# Altium footprint library BKRES_PcbLib.PcbLib: 33 footprints (part 1 of 3)
Each footprint in its own frame and in the unit in brackets; x right, y up, seen from the top. Pads: shape width x height; smd on the part's side, far side on the other; paste and mask are expansions set on the pad; w line width, h text height; cw(c..) or ccw(c..) is an arc to the next point about the centre after c.
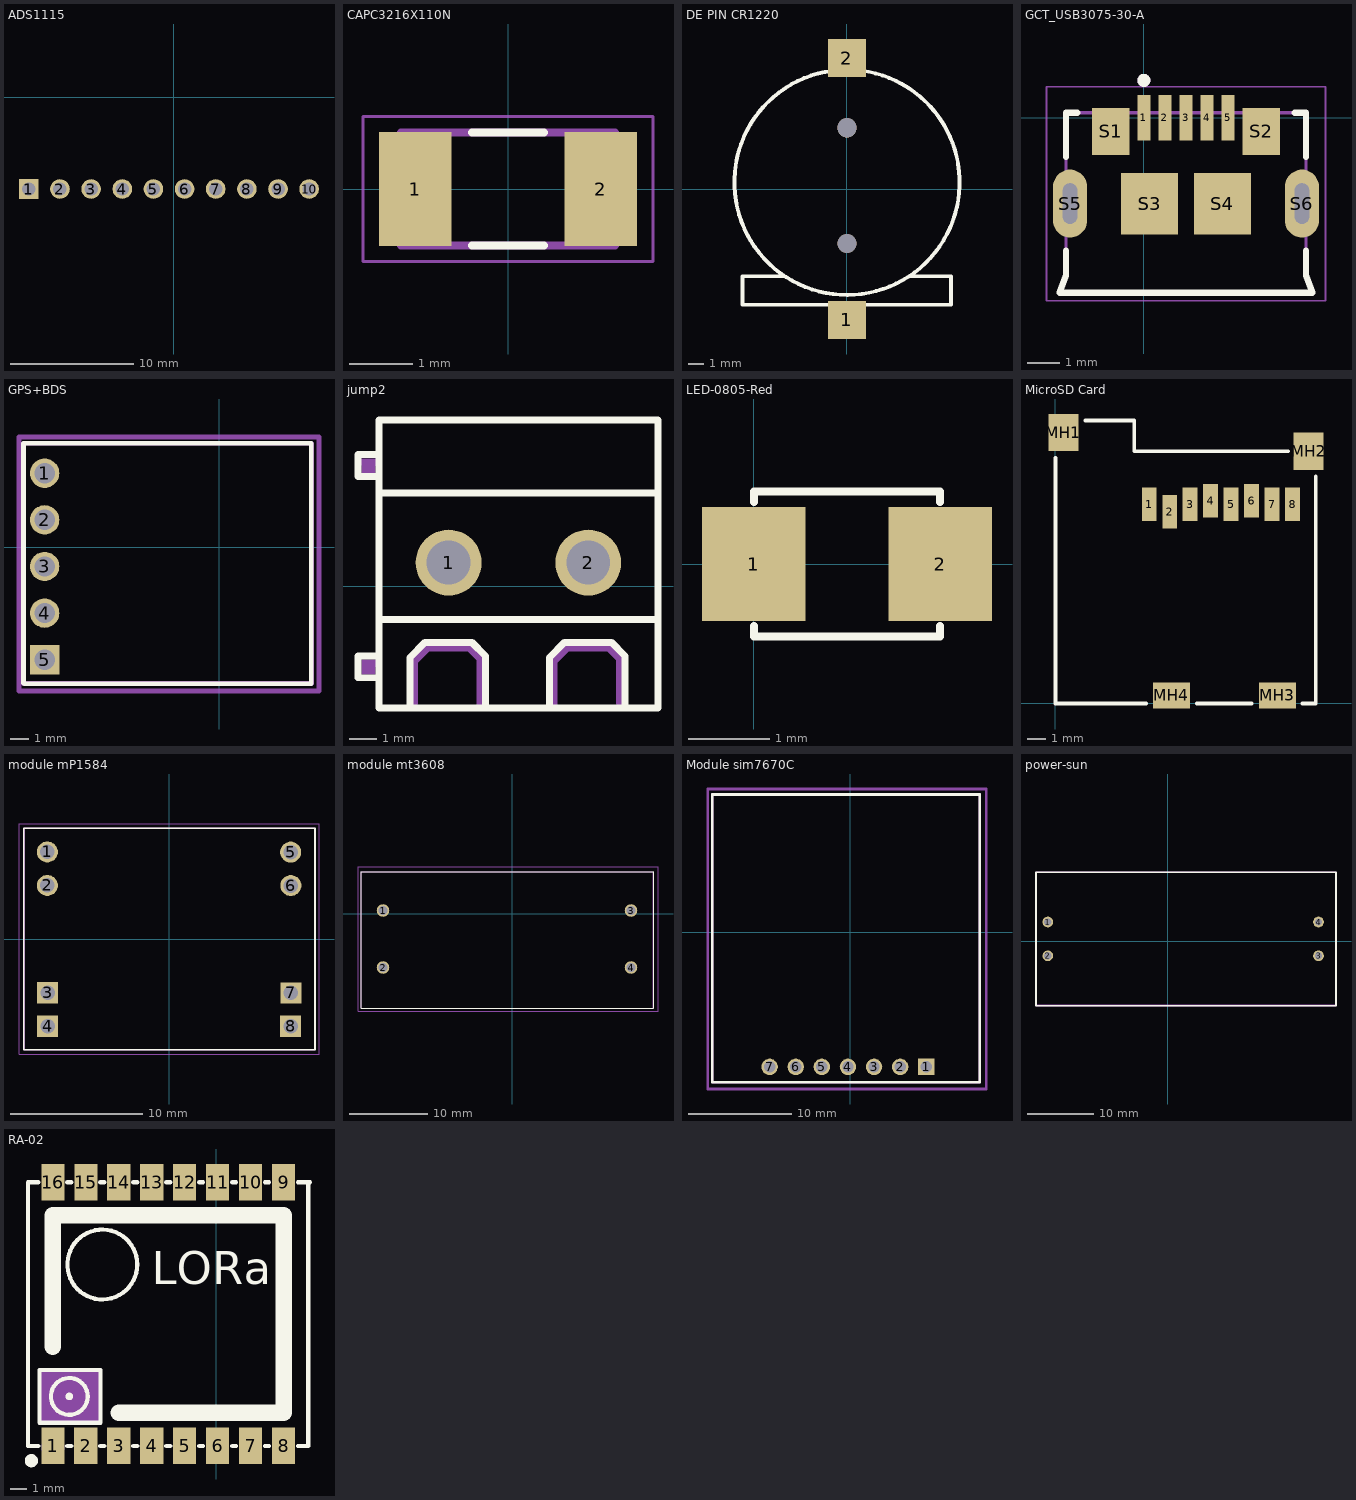
[diagram p0: the footprints below, top view; thin cyan lines are the x and y axes]

## ADS1115 [mm]
pads (10):
  rect 1.6x1.6 hole 1.1: 1(-11.811,-7.493)
  round 1.6 hole 1.1: 2(-9.271,-7.493) 3(-6.731,-7.493) 4(-4.191,-7.493) 5(-1.651,-7.493) 6(0.889,-7.493) 7(3.429,-7.493) 8(5.969,-7.493) 9(8.509,-7.493) 10(11.049,-7.493)
3D body "16Bit I2C ADC+PGA - ADS1115.stp": height 13.74, standoff 11, extent -14.351,-9.525 13.589,7.747

## CAPC3216X110N [mm]
pads (2):
  rect 1.16x1.82 smd: 1(-1.475,0) 2(1.475,0)
Top Overlay:
  lines w0.127: -0.57,-0.9 0.57,-0.9 ; -0.57,0.9 0.57,0.9
Mechanical 13:
  lines w0.127: -1.7,-0.9 1.7,-0.9 1.7,0.9 -1.7,0.9 -1.7,-0.9
Mechanical 15:
  lines w0.05: -2.308,-1.15 2.308,-1.15 2.308,1.15 -2.308,1.15 -2.308,-1.15
3D body "T491A105M016AT.STEP": height 1.8, standoff 0, extent -1.6,-0.8 1.6,0.8

## DE PIN CR1220 [mm]
pads (2):
  rect 2.5x2.5 smd: 1(0,-8.6) 2(0,8.6)
via 0.005,-3.579 diameter 1.27 hole 1.27
via 0,4.026 diameter 1.27 hole 1.27
Top Overlay:
  lines w0.254: -4.194,-5.725 -6.868,-5.725 -6.868,-7.6 6.833,-7.6 6.833,-5.725 4.158,-5.725 ; -0.038,7.836 ccw(c0.005,0.439) 0,7.836
3D body "CR1220 SMD.STEP": height 4.27, standoff -0.48, extent -7.389,-9.42 7.36,9.38

## DO [mm]
3D body "Gravity Dissolved Oxygen Sensor v1.0.STEP": height 13.2, standoff 0, extent -33.737,-25.525 29.763,6.475

## EC [mm]
3D body "EC MEter DF Robot v1 v1.step": height 12.6, standoff 0, extent -15.49,-23.077 16.51,42.635

## GCT_USB3075-30-A [mm]
height 2.66
pads (11):
  rect 0.4x1.4 smd: 1(0,0) 2(0.65,0) 3(1.3,0) 4(1.95,0) 5(2.6,0)
  rect 1.15x1.45 smd: S1(-1.02,-0.42) S2(3.62,-0.42)
  rect 1.75x1.9 smd: S3(0.175,-2.65) S4(2.425,-2.65)
  oval 1.05x2.1 hole 0.45 slot 1.25 at 90 deg: S5(-2.275,-2.65) S6(4.875,-2.65)
Top Overlay:
  circle w0.2: c0,1.15 r0.1
  lines w0.2: -2.4,-4.1 -2.4,-4.86 -2.6,-5.4 5.2,-5.4 5,-4.86 5,-4.1 ; -2.4,-1.2 -2.4,0.15 -2.05,0.15 ; 4.65,0.15 5,0.15 5,-1.2
Mechanical 13:
  circle w0.2: c0,1.15 r0.1
  lines w0.1: -2.6,-5.4 -2.4,-4.86 -2.4,0.15 5,0.15 5,-4.86 5.2,-5.4 -2.6,-5.4
Mechanical 15:
  lines w0.05: -3,-5.65 5.6,-5.65 5.6,0.95 -3,0.95 -3,-5.65
3D body "step_temp.STEP": height 2.7, standoff -1, extent -2.583,-5.373 5.217,0.177

## GPS+BDS [mm]
pads (5):
  round 1.6 hole 1.1: 1(-9.498,4.024) 2(-9.498,1.484) 3(-9.498,-1.056) 4(-9.498,-3.596)
  rect 1.6x1.6 hole 1.1: 5(-9.498,-6.136)
Top Overlay:
  lines w0.254: -10.652,5.647 -10.652,-7.408 -10.619,-7.441 5.011,-7.441 5.022,-7.43 5.022,5.647 5.011,5.658 -10.641,5.658
Mechanical 1:
  lines w0.254: -10.663,-7.419 -10.652,-7.43 ; -10.663,5.637 -10.641,5.658 ; 5.022,-7.43 5.033,-7.441
Mechanical 13:
  lines w0.254: -10.663,-7.419 -10.663,5.637 ; -10.652,-7.43 5.022,-7.43 ; -10.641,5.658 5.033,5.658 5.033,-7.441
Mechanical 15:
  lines w0.254: -10.897,-7.837 -10.897,-7.707 -10.897,5.994 5.445,5.994 5.445,-7.837 -10.897,-7.837
3D body: height 11.5, standoff 11, extent -10.709,-7.456 5.024,5.647

## jump2 [mm]
pads (2):
  round 2.4 hole 1.6 paste-2539.97 mask+0.051: 1(-13.335,0.855) 2(-8.255,0.855)
Top Overlay:
  lines w0.254: -15.875,-3.336 -16.637,-3.336 -16.637,-2.538 -15.875,-2.538 ; -15.875,-1.218 -5.715,-1.218 ; -15.875,3.392 -5.715,3.392 ; -15.875,3.994 -16.637,3.994 -16.637,4.792 -15.875,4.792 ; -14.745,-4.445 -14.745,-2.595 -14.195,-2.045 -12.495,-2.045 -11.995,-2.545 -11.995,-4.445 ; -9.665,-4.445 -9.665,-2.595 -9.115,-2.045 -7.415,-2.045 -6.915,-2.545 -6.915,-4.445 ; -15.875,-4.445 -5.715,-4.445 -5.715,6.055 -15.875,6.055 -15.875,-4.445
Mechanical 15:
  region: -15.995,4.645 -16.515,4.645 -16.505,4.135 -16.015,4.115
  region: -15.995,-2.675 -16.505,-2.675 -16.505,-3.205 -16.015,-3.205
  region: -14.722,-4.245 -14.722,-2.745 -14.722,-2.732 -14.717,-2.708 -14.708,-2.685 -14.694,-2.664 -14.685,-2.655 -14.185,-2.155 -14.176,-2.146 -14.155,-2.132 -14.132,-2.123 -14.108,-2.118 -14.095,-2.118 -12.595,-2.118 -12.583,-2.118 -12.558,-2.123 -12.535,-2.132 -12.514,-2.146 -12.505,-2.155 -12.105,-2.555 -12.096,-2.564 -12.082,-2.585 -12.073,-2.608 -12.068,-2.632 -12.068,-2.645 -12.068,-4.245 -12.068,-4.298 -12.142,-4.372 -12.248,-4.372 -12.322,-4.298 -12.322,-4.245 -12.322,-2.698 -12.648,-2.372 -14.042,-2.372 -14.468,-2.798 -14.468,-4.245 -14.468,-4.298 -14.542,-4.372 -14.648,-4.372 -14.722,-4.298
  region: -9.642,-4.245 -9.642,-2.745 -9.642,-2.732 -9.637,-2.708 -9.628,-2.685 -9.614,-2.664 -9.605,-2.655 -9.105,-2.155 -9.096,-2.146 -9.075,-2.132 -9.052,-2.123 -9.028,-2.118 -9.015,-2.118 -7.515,-2.118 -7.503,-2.118 -7.478,-2.123 -7.455,-2.132 -7.434,-2.146 -7.425,-2.155 -7.025,-2.555 -7.016,-2.564 -7.002,-2.585 -6.993,-2.608 -6.988,-2.632 -6.988,-2.645 -6.988,-4.245 -6.988,-4.298 -7.062,-4.372 -7.168,-4.372 -7.242,-4.298 -7.242,-4.245 -7.242,-2.698 -7.568,-2.372 -8.962,-2.372 -9.388,-2.798 -9.388,-4.245 -9.388,-4.298 -9.462,-4.372 -9.568,-4.372 -9.642,-4.298
3D body "KF128-5.08-2P.STEP": height 14.59, standoff -3.36, extent -16.429,-4.318 -5.669,5.982

## LED-0805-Red [mil]
pads (2):
  rect 50x55 smd: 1(0,0) 2(90,0)
Top Overlay:
  lines w4: 0,-30 0,-35 90,-35 90,-30 ; 0,30 0,35 90,35 90,30
3D body "User Library-led_0805-red.step": height 43.31, standoff 0, extent 5.25,-24.6 84.77,24.62

## MicroSD Card [mm] "Connector; SD Card Type A, SM, 9 Position, Right Angle, Pitch 2.5 mm, Body 23.3 x 27.4 x 3.4 mm (LxWxH)"
height 3.4
pads (12):
  rect 0.8x1.8 smd: 1(5.04,10.7) 2(6.14,10.3) 3(7.24,10.7) 4(8.34,10.9) 5(9.44,10.7) 6(10.54,10.9) 7(11.64,10.7) 8(12.74,10.7)
  rect 1.6x2 smd: MH1(0.43,14.55) MH2(13.6,13.55)
  rect 2x1.4 smd: MH3(11.93,0.43) MH4(6.23,0.43)
Top Overlay:
  lines w0.2: 0,13.18 0,0 4.87,0 ; 1.6,15.2 4.24,15.2 4.24,13.55 12.5,13.55 ; 7.59,0 10.55,0 ; 13.27,0 13.98,0 13.98,12.19
3D body "SW3dPS-micro sd soket.STEP": height 1.72, standoff -0.01, extent -0.21,-0.49 14.39,15.51

## module mP1584 [mm]
height 6.6
pads (8):
  round 1.6 hole 1.1: 1(-9.271,6.604) 2(-9.271,4.064) 5(9.2,6.59) 6(9.21,4.06)
  rect 1.6x1.6 hole 1.1: 3(-9.25,-4.08) 4(-9.25,-6.62) 7(9.21,-4.09) 8(9.19,-6.62)
Top Overlay:
  lines w0.127: -11.06,-8.4 -11.06,8.4 11.04,8.4 11.04,-8.4 -11.06,-8.4
Mechanical 13:
  lines w0.127: -11.04,-8.4 -11.04,8.4 11.06,8.4 11.06,-8.4 -11.04,-8.4
Mechanical 15:
  lines w0.05: -11.42,-8.76 11.35,-8.76 11.35,8.76 -11.42,8.76 -11.42,-8.76
3D body "D-SUN dc-dc step down converter.step": height 15.19, standoff 11, extent -11.05,-8.4 11.05,8.4

## module mt3608 [mm]
height 6.6
pads (4):
  round 1.6 hole 1.1: 1(-16.383,0.381) 2(-16.383,-6.858) 3(15.113,0.381) 4(15.113,-6.858)
Top Overlay:
  lines w0.127: -19.177,-12.065 -19.177,5.334 17.907,5.334 17.907,-12.065 -19.177,-12.065
Mechanical 13:
  lines w0.127: -19.177,-12.065 -19.177,5.334 17.907,5.334 17.907,-12.065 -19.177,-12.065
Mechanical 15:
  lines w0.05: -19.558,-12.446 18.542,-12.446 18.542,5.969 -19.558,5.969 -19.558,-12.446
3D body "MT3608 Converter.STEP": height 15.15, standoff 7.85, extent -19.21,-12.091 17.94,5.334
3D body "1x1 Male Pin Header.stp": height 1.54, standoff -12, extent 13.838,-0.869 16.383,1.631
3D body "1x1 Male Pin Header.stp": height 1.54, standoff -12, extent 13.843,-8.125 16.388,-5.625
3D body "1x1 Male Pin Header.stp": height 1.54, standoff -12, extent -17.676,-0.846 -15.131,1.654
3D body "1x1 Male Pin Header.stp": height 1.54, standoff -12, extent -17.648,-8.103 -15.103,-5.603

## Module sim7670C [mm]
pads (7):
  rect 1.6x1.6 hole 1.1: 1(7.408,-13.095)
  round 1.6 hole 1.1: 2(4.868,-13.095) 3(2.328,-13.095) 4(-0.212,-13.095) 5(-2.752,-13.095) 6(-5.292,-13.095) 7(-7.832,-13.095)
Top Overlay:
  lines w0.254: -13.395,-14.601 12.605,-14.601 12.605,13.399 -13.395,13.399 -13.395,-14.601
Mechanical 13:
  lines w0.254: -13.395,-14.601 12.605,-14.601 12.605,13.399 -13.395,13.399 -13.395,-14.601
Mechanical 15:
  lines w0.254: -13.866,-15.248 13.258,-15.248 13.258,13.935 -13.866,13.935 -13.866,-15.248
3D body: height 12.24, standoff 11, extent -13.395,-14.601 12.605,13.399

## pH [mm]
3D body "pH_meter_CC.step": height 18.04, standoff -4.75, extent -32.131,-16.383 31.748,15.367

## power-sun [mm]
pads (4):
  round 1.6 hole 1.1: 1(-17.95,2.883) 2(-17.95,-2.197) 3(22.65,-2.197) 4(22.65,2.883)
Top Overlay:
  lines w0.254: -19.736,-9.677 25.273,-9.677 25.273,10.351 -19.736,10.351 -19.736,-9.677
Mechanical 13:
  lines w0.254: -19.736,-9.652 -19.736,10.348 ; -19.727,-9.652 25.273,-9.652 ; -19.727,10.351 25.26,10.351 25.26,-9.652
3D body: height 26, standoff 11, extent -19.736,-9.677 25.286,10.325

## RA-02 [mm]
pads (16):
  rect 1.4x2.2 smd paste+0 mask+0.051: 1(-9.927,-27.475) 2(-7.927,-27.475) 3(-5.927,-27.475) 4(-3.927,-27.475) 5(-1.927,-27.475) 6(0.073,-27.475) 7(2.073,-27.475) 8(4.073,-27.475) 9(4.073,-11.475) 10(2.073,-11.475) 11(0.073,-11.475) 12(-1.927,-11.475) 13(-3.927,-11.475) 14(-5.927,-11.475) 15(-7.925,-11.475) 16(-9.927,-11.475)
Top Overlay:
  circle w0.254: c-8.927,-24.475 r1.118
  circle w0.254: c-8.927,-24.475 r0.1
  circle w0.254: c-6.926,-16.473 r2.121
  circle w0.4: c-11.227,-28.375 r0.2
  lines w0.254: -10.808,-27.479 -11.43,-27.479 -11.43,-11.479 -10.808,-11.479 ; -9.046,-27.479 -8.808,-27.479 ; -9.046,-11.479 -8.807,-11.479 ; -7.046,-27.479 -6.808,-27.479 ; -7.044,-11.479 -6.808,-11.479 ; -5.046,-27.479 -4.808,-27.479 ; -5.046,-11.479 -4.808,-11.479 ; -3.046,-27.479 -2.808,-27.479 ; -3.046,-11.479 -2.808,-11.479 ; -1.046,-27.479 -0.808,-27.479 ; -1.046,-11.479 -0.808,-11.479 ; 0.954,-27.479 1.192,-27.479 ; 0.954,-11.479 1.192,-11.479 ; 2.954,-27.479 3.192,-27.479 ; 2.954,-11.479 3.192,-11.479 ; 4.954,-27.479 5.573,-27.479 ; 4.954,-11.479 5.673,-11.479 ; 5.573,-27.475 5.573,-11.475 ; -10.727,-26.075 -7.027,-26.075 -7.027,-22.875 -10.727,-22.875 -10.727,-26.075
  lines w1: -9.927,-21.475 -9.927,-13.475 4.073,-13.475 4.073,-25.475 -5.927,-25.475
  text "LORa" at -3.927,-17.658 h2
Mechanical 15:
  circle w0.7: c-9.927,-27.575 r0.35
  region: -10.785,-22.875 -6.985,-22.875 -6.985,-26.075 -10.785,-26.075 -10.785,-25.175
3D body "LoRa_Module_RA-02_AiThinker.step": height 3.03, standoff 0, extent -11.303,-27.432 5.697,-11.432